# Altium schematic symbol library jlcpcb_2025_04_capacitors_extended_1206.schlib: 2503 symbols (part 9 of 14) (continued)
## EMK316BJ106ML-T
designator C?  Capacitance: 10uF  (hidden comment: *)
Capacitor, Ceramic (MLCC), 10uF, ±20%, 16V, X5R, ±20%, SMD 1206; Manufacturer: Taiyo Yuden; Manufacturer Part Number: EMK316BJ106ML-T; Package Size: 1206; JLCPCB Basic Part: No; JLCPCB Part Number: C412623; Supplier 1: LCSC; Category: Capacitors - MLCC; Supplier Part Number 1: C412623; Tolerance: ±20%; Voltage Rating: 16V; Temperature Coefficient: X5R; RoHS: Yes; ComponentLink1Description: Datasheet; ComponentLink1URL: https://wmsc.lcsc.com/wmsc/upload/file/pdf/v2/lcsc/2211282230_Taiyo-Yuden-EMK316BJ106ML-T_C412623.pdf; ComponentLink2Description: JLCPCB Part URL; ComponentLink2URL: https://jlcpcb.com/partdetail/C412623; ComponentLink3Description: LCSC Part URL; ComponentLink3URL: https://lcsc.com/product-detail/Multilayer-Ceramic-Capacitors-MLCC---SMD-SMT_Taiyo-Yuden-Taiyo-Yuden-EMK316BJ106ML-T_C412623.html
footprint CAP-1206 (1206 (3216M) Capacitor)
pins: 1, 2

## EMK316BJ225KL-T
designator C?  Capacitance: 2.2uF  (hidden comment: *)
Capacitor, Ceramic (MLCC), 2.2uF, ±10%, 16V, X5R, ±10%, SMD 1206; Manufacturer: Taiyo Yuden; Manufacturer Part Number: EMK316BJ225KL-T; Package Size: 1206; JLCPCB Basic Part: No; JLCPCB Part Number: C189991; Supplier 1: LCSC; Category: Capacitors - MLCC; Supplier Part Number 1: C189991; Tolerance: ±10%; Voltage Rating: 16V; Temperature Coefficient: X5R; RoHS: Yes; ComponentLink1Description: Datasheet; ComponentLink1URL: https://wmsc.lcsc.com/wmsc/upload/file/pdf/v2/lcsc/2304140030_Taiyo-Yuden-EMK316BJ225KL-T_C189991.pdf; ComponentLink2Description: JLCPCB Part URL; ComponentLink2URL: https://jlcpcb.com/partdetail/C189991; ComponentLink3Description: LCSC Part URL; ComponentLink3URL: https://lcsc.com/product-detail/Multilayer-Ceramic-Capacitors-MLCC---SMD-SMT_Taiyo-Yuden-Taiyo-Yuden-EMK316BJ225KL-T_C189991.html
footprint CAP-1206 (1206 (3216M) Capacitor)
pins: 1, 2

## EMK316BJ226KL-T
designator C?  Capacitance: 22uF  (hidden comment: *)
Capacitor, Ceramic (MLCC), 22uF, ±10%, 16V, X5R, ±10%, SMD 1206; Manufacturer: Taiyo Yuden; Manufacturer Part Number: EMK316BJ226KL-T; Package Size: 1206; JLCPCB Basic Part: No; JLCPCB Part Number: C268012; Supplier 1: LCSC; Category: Capacitors - MLCC; Supplier Part Number 1: C268012; Tolerance: ±10%; Voltage Rating: 16V; Temperature Coefficient: X5R; RoHS: Yes; ComponentLink1Description: Datasheet; ComponentLink1URL: https://wmsc.lcsc.com/wmsc/upload/file/pdf/v2/lcsc/2211282230_Taiyo-Yuden-EMK316BJ226KL-T_C268012.pdf; ComponentLink2Description: JLCPCB Part URL; ComponentLink2URL: https://jlcpcb.com/partdetail/C268012; ComponentLink3Description: LCSC Part URL; ComponentLink3URL: https://lcsc.com/product-detail/Multilayer-Ceramic-Capacitors-MLCC---SMD-SMT_Taiyo-Yuden-Taiyo-Yuden-EMK316BJ226KL-T_C268012.html
footprint CAP-1206 (1206 (3216M) Capacitor)
pins: 1, 2

## EMK316BJ226ML-T
designator C?  Capacitance: 22uF  (hidden comment: *)
Capacitor, Ceramic (MLCC), 22uF, ±20%, 16V, X5R, ±20%, SMD 1206; Manufacturer: Taiyo Yuden; Manufacturer Part Number: EMK316BJ226ML-T; Package Size: 1206; JLCPCB Basic Part: No; JLCPCB Part Number: C87162; Supplier 1: LCSC; Category: Capacitors - MLCC; Supplier Part Number 1: C87162; Tolerance: ±20%; Voltage Rating: 16V; Temperature Coefficient: X5R; RoHS: Yes; ComponentLink1Description: Datasheet; ComponentLink1URL: https://wmsc.lcsc.com/wmsc/upload/file/pdf/v2/lcsc/2211282300_Taiyo-Yuden-EMK316BJ226ML-T_C87162.pdf; ComponentLink2Description: JLCPCB Part URL; ComponentLink2URL: https://jlcpcb.com/partdetail/C87162; ComponentLink3Description: LCSC Part URL; ComponentLink3URL: https://lcsc.com/product-detail/Multilayer-Ceramic-Capacitors-MLCC---SMD-SMT_Taiyo-Yuden-Taiyo-Yuden-EMK316BJ226ML-T_C87162.html
footprint CAP-1206 (1206 (3216M) Capacitor)
pins: 1, 2

## EMK316BJ475KL-T
designator C?  Capacitance: 4.7uF  (hidden comment: *)
Capacitor, Ceramic (MLCC), 4.7uF, ±10%, 16V, X5R, ±10%, SMD 1206; Manufacturer: Taiyo Yuden; Manufacturer Part Number: EMK316BJ475KL-T; Package Size: 1206; JLCPCB Basic Part: No; JLCPCB Part Number: C92766; Supplier 1: LCSC; Category: Capacitors - MLCC; Supplier Part Number 1: C92766; Tolerance: ±10%; Voltage Rating: 16V; Temperature Coefficient: X5R; RoHS: Yes; ComponentLink1Description: Datasheet; ComponentLink1URL: https://wmsc.lcsc.com/wmsc/upload/file/pdf/v2/lcsc/2211282300_Taiyo-Yuden-EMK316BJ475KL-T_C92766.pdf; ComponentLink2Description: JLCPCB Part URL; ComponentLink2URL: https://jlcpcb.com/partdetail/C92766; ComponentLink3Description: LCSC Part URL; ComponentLink3URL: https://lcsc.com/product-detail/Multilayer-Ceramic-Capacitors-MLCC---SMD-SMT_Taiyo-Yuden-Taiyo-Yuden-EMK316BJ475KL-T_C92766.html
footprint CAP-1206 (1206 (3216M) Capacitor)
pins: 1, 2

## FM31N101J501PXG
designator C?  Capacitance: 100pF  (hidden comment: *)
Capacitor, Ceramic (MLCC), 100pF, ±5%, 500V, C0G, ±5%, SMD 1206; Manufacturer: PSA(Prosperity Dielectrics); Manufacturer Part Number: FM31N101J501PXG; Package Size: 1206; JLCPCB Basic Part: No; JLCPCB Part Number: C525184; Supplier 1: LCSC; Category: Capacitors - MLCC; Supplier Part Number 1: C525184; Tolerance: ±5%; Voltage Rating: 500V; Temperature Coefficient: C0G; RoHS: Yes; ComponentLink1Description: Datasheet; ComponentLink1URL: https://wmsc.lcsc.com/wmsc/upload/file/pdf/v2/lcsc/2304140030_PSA-Prosperity-Dielectrics-FM31N101J501PXG_C525184.pdf; ComponentLink2Description: JLCPCB Part URL; ComponentLink2URL: https://jlcpcb.com/partdetail/C525184; ComponentLink3Description: LCSC Part URL; ComponentLink3URL: https://lcsc.com/product-detail/Multilayer-Ceramic-Capacitors-MLCC---SMD-SMT_PSAProsperity-Dielectrics-PSAProsperity-Dielectrics-FM31N101J501PXG_C525184.html
footprint CAP-1206 (1206 (3216M) Capacitor)
pins: 1, 2

## FM31N102J631EEG
designator C?  Capacitance: 1nF  (hidden comment: *)
Capacitor, Ceramic (MLCC), 1nF, ±5%, 630V, C0G, ±5%, SMD 1206; Manufacturer: PSA(Prosperity Dielectrics); Manufacturer Part Number: FM31N102J631EEG; Package Size: 1206; JLCPCB Basic Part: No; JLCPCB Part Number: C382237; Supplier 1: LCSC; Category: Capacitors - MLCC; Supplier Part Number 1: C382237; Tolerance: ±5%; Voltage Rating: 630V; Temperature Coefficient: C0G; RoHS: Yes; ComponentLink1Description: Datasheet; ComponentLink1URL: https://wmsc.lcsc.com/wmsc/upload/file/pdf/v2/lcsc/2304140030_PSA-Prosperity-Dielectrics-FM31N102J631EEG_C382237.pdf; ComponentLink2Description: JLCPCB Part URL; ComponentLink2URL: https://jlcpcb.com/partdetail/C382237; ComponentLink3Description: LCSC Part URL; ComponentLink3URL: https://lcsc.com/product-detail/Multilayer-Ceramic-Capacitors-MLCC---SMD-SMT_PSAProsperity-Dielectrics-PSAProsperity-Dielectrics-FM31N102J631EEG_C382237.html
footprint CAP-1206 (1206 (3216M) Capacitor)
pins: 1, 2

## FM31N103J101ECG
designator C?  Capacitance: 10nF  (hidden comment: *)
Capacitor, Ceramic (MLCC), 10nF, ±5%, 100V, NP0, ±5%, SMD 1206; Manufacturer: PSA(Prosperity Dielectrics); Manufacturer Part Number: FM31N103J101ECG; Package Size: 1206; JLCPCB Basic Part: No; JLCPCB Part Number: C784087; Supplier 1: LCSC; Category: Capacitors - MLCC; Supplier Part Number 1: C784087; Tolerance: ±5%; Voltage Rating: 100V; Temperature Coefficient: NP0; RoHS: Yes; ComponentLink1Description: Datasheet; ComponentLink1URL: https://wmsc.lcsc.com/wmsc/upload/file/pdf/v2/lcsc/2304140030_PSA-Prosperity-Dielectrics-FM31N103J101ECG_C784087.pdf; ComponentLink2Description: JLCPCB Part URL; ComponentLink2URL: https://jlcpcb.com/partdetail/C784087; ComponentLink3Description: LCSC Part URL; ComponentLink3URL: https://lcsc.com/product-detail/Multilayer-Ceramic-Capacitors-MLCC---SMD-SMT_PSAProsperity-Dielectrics-PSAProsperity-Dielectrics-FM31N103J101ECG_C784087.html
footprint CAP-1206 (1206 (3216M) Capacitor)
pins: 1, 2

## FM31N122J631EEG
designator C?  Capacitance: 1.2nF  (hidden comment: *)
Capacitor, Ceramic (MLCC), 1.2nF, ±5%, 630V, C0G, ±5%, SMD 1206; Manufacturer: PSA(Prosperity Dielectrics); Manufacturer Part Number: FM31N122J631EEG; Package Size: 1206; JLCPCB Basic Part: No; JLCPCB Part Number: C2929774; Supplier 1: LCSC; Category: Capacitors - MLCC; Supplier Part Number 1: C2929774; Tolerance: ±5%; Voltage Rating: 630V; Temperature Coefficient: C0G; RoHS: Yes; ComponentLink1Description: Datasheet; ComponentLink1URL: https://wmsc.lcsc.com/wmsc/upload/file/pdf/v2/lcsc/2209061730_PSA-Prosperity-Dielectrics-FM31N122J631EEG_C2929774.pdf; ComponentLink2Description: JLCPCB Part URL; ComponentLink2URL: https://jlcpcb.com/partdetail/C2929774; ComponentLink3Description: LCSC Part URL; ComponentLink3URL: https://lcsc.com/product-detail/Multilayer-Ceramic-Capacitors-MLCC---SMD-SMT_PSAProsperity-Dielectrics-PSAProsperity-Dielectrics-FM31N122J631EEG_C2929774.html
footprint CAP-1206 (1206 (3216M) Capacitor)
pins: 1, 2

## FM31N152J631EEG
designator C?  Capacitance: 1.5nF  (hidden comment: *)
Capacitor, Ceramic (MLCC), 1.5nF, ±5%, 630V, C0G, ±5%, SMD 1206; Manufacturer: PSA(Prosperity Dielectrics); Manufacturer Part Number: FM31N152J631EEG; Package Size: 1206; JLCPCB Basic Part: No; JLCPCB Part Number: C146175; Supplier 1: LCSC; Category: Capacitors - MLCC; Supplier Part Number 1: C146175; Tolerance: ±5%; Voltage Rating: 630V; Temperature Coefficient: C0G; RoHS: Yes; ComponentLink1Description: Datasheet; ComponentLink1URL: https://wmsc.lcsc.com/wmsc/upload/file/pdf/v2/lcsc/2304140030_PSA-Prosperity-Dielectrics-FM31N152J631EEG_C146175.pdf; ComponentLink2Description: JLCPCB Part URL; ComponentLink2URL: https://jlcpcb.com/partdetail/C146175; ComponentLink3Description: LCSC Part URL; ComponentLink3URL: https://lcsc.com/product-detail/Multilayer-Ceramic-Capacitors-MLCC---SMD-SMT_PSAProsperity-Dielectrics-PSAProsperity-Dielectrics-FM31N152J631EEG_C146175.html
footprint CAP-1206 (1206 (3216M) Capacitor)
pins: 1, 2

## FM31N222J501EEG
designator C?  Capacitance: 2.2nF  (hidden comment: *)
Capacitor, Ceramic (MLCC), 2.2nF, ±5%, 500V, NP0, ±5%, SMD 1206; Manufacturer: PSA(Prosperity Dielectrics); Manufacturer Part Number: FM31N222J501EEG; Package Size: 1206; JLCPCB Basic Part: No; JLCPCB Part Number: C784088; Supplier 1: LCSC; Category: Capacitors - MLCC; Supplier Part Number 1: C784088; Tolerance: ±5%; Voltage Rating: 500V; Temperature Coefficient: NP0; RoHS: Yes; ComponentLink1Description: Datasheet; ComponentLink1URL: https://wmsc.lcsc.com/wmsc/upload/file/pdf/v2/lcsc/2304140030_PSA-Prosperity-Dielectrics-FM31N222J501EEG_C784088.pdf; ComponentLink2Description: JLCPCB Part URL; ComponentLink2URL: https://jlcpcb.com/partdetail/C784088; ComponentLink3Description: LCSC Part URL; ComponentLink3URL: https://lcsc.com/product-detail/Multilayer-Ceramic-Capacitors-MLCC---SMD-SMT_PSAProsperity-Dielectrics-PSAProsperity-Dielectrics-FM31N222J501EEG_C784088.html
footprint CAP-1206 (1206 (3216M) Capacitor)
pins: 1, 2

## FM31N222J631EEG
designator C?  Capacitance: 2.2nF  (hidden comment: *)
Capacitor, Ceramic (MLCC), 2.2nF, ±5%, 630V, NP0, ±5%, SMD 1206; Manufacturer: PSA(Prosperity Dielectrics); Manufacturer Part Number: FM31N222J631EEG; Package Size: 1206; JLCPCB Basic Part: No; JLCPCB Part Number: C784089; Supplier 1: LCSC; Category: Capacitors - MLCC; Supplier Part Number 1: C784089; Tolerance: ±5%; Voltage Rating: 630V; Temperature Coefficient: NP0; RoHS: Yes; ComponentLink1Description: Datasheet; ComponentLink1URL: https://wmsc.lcsc.com/wmsc/upload/file/pdf/v2/lcsc/2304140030_PSA-Prosperity-Dielectrics-FM31N222J631EEG_C784089.pdf; ComponentLink2Description: JLCPCB Part URL; ComponentLink2URL: https://jlcpcb.com/partdetail/C784089; ComponentLink3Description: LCSC Part URL; ComponentLink3URL: https://lcsc.com/product-detail/Multilayer-Ceramic-Capacitors-MLCC---SMD-SMT_PSAProsperity-Dielectrics-PSAProsperity-Dielectrics-FM31N222J631EEG_C784089.html
footprint CAP-1206 (1206 (3216M) Capacitor)
pins: 1, 2

## FM31N270J501PXG
designator C?  Capacitance: 27pF  (hidden comment: *)
Capacitor, Ceramic (MLCC), 27pF, ±5%, 500V, C0G, ±5%, SMD 1206; Manufacturer: PSA(Prosperity Dielectrics); Manufacturer Part Number: FM31N270J501PXG; Package Size: 1206; JLCPCB Basic Part: No; JLCPCB Part Number: C382236; Supplier 1: LCSC; Category: Capacitors - MLCC; Supplier Part Number 1: C382236; Tolerance: ±5%; Voltage Rating: 500V; Temperature Coefficient: C0G; RoHS: Yes; ComponentLink1Description: Datasheet; ComponentLink1URL: https://wmsc.lcsc.com/wmsc/upload/file/pdf/v2/lcsc/2304140030_PSA-Prosperity-Dielectrics-FM31N270J501PXG_C382236.pdf; ComponentLink2Description: JLCPCB Part URL; ComponentLink2URL: https://jlcpcb.com/partdetail/C382236; ComponentLink3Description: LCSC Part URL; ComponentLink3URL: https://lcsc.com/product-detail/Multilayer-Ceramic-Capacitors-MLCC---SMD-SMT_PSAProsperity-Dielectrics-PSAProsperity-Dielectrics-FM31N270J501PXG_C382236.html
footprint CAP-1206 (1206 (3216M) Capacitor)
pins: 1, 2

## FM31N332J101PXG
designator C?  Capacitance: 3.3nF  (hidden comment: *)
Capacitor, Ceramic (MLCC), 3.3nF, ±5%, 100V, C0G, ±5%, SMD 1206; Manufacturer: PSA(Prosperity Dielectrics); Manufacturer Part Number: FM31N332J101PXG; Package Size: 1206; JLCPCB Basic Part: No; JLCPCB Part Number: C2915710; Supplier 1: LCSC; Category: Capacitors - MLCC; Supplier Part Number 1: C2915710; Tolerance: ±5%; Voltage Rating: 100V; Temperature Coefficient: C0G; RoHS: Yes; ComponentLink1Description: Datasheet; ComponentLink1URL: https://wmsc.lcsc.com/wmsc/upload/file/pdf/v2/lcsc/2111161730_PSA-Prosperity-Dielectrics-FM31N332J101PXG_C2915710.pdf; ComponentLink2Description: JLCPCB Part URL; ComponentLink2URL: https://jlcpcb.com/partdetail/C2915710; ComponentLink3Description: LCSC Part URL; ComponentLink3URL: https://lcsc.com/product-detail/Multilayer-Ceramic-Capacitors-MLCC---SMD-SMT_PSAProsperity-Dielectrics-PSAProsperity-Dielectrics-FM31N332J101PXG_C2915710.html
footprint CAP-1206 (1206 (3216M) Capacitor)
pins: 1, 2

## FM31N332J631EEG
designator C?  Capacitance: 3.3nF  (hidden comment: *)
Capacitor, Ceramic (MLCC), 3.3nF, 630V, C0G, SMD 1206; Manufacturer: PSA(Prosperity Dielectrics); Manufacturer Part Number: FM31N332J631EEG; Package Size: 1206; JLCPCB Basic Part: No; JLCPCB Part Number: C2929777; Supplier 1: LCSC; Category: Capacitors - MLCC; Supplier Part Number 1: C2929777; Voltage Rating: 630V; Temperature Coefficient: C0G; RoHS: Yes; ComponentLink1Description: Datasheet; ComponentLink1URL: https://wmsc.lcsc.com/wmsc/upload/file/pdf/v2/lcsc/2209061730_PSA-Prosperity-Dielectrics-FM31N332J631EEG_C2929777.pdf; ComponentLink2Description: JLCPCB Part URL; ComponentLink2URL: https://jlcpcb.com/partdetail/C2929777; ComponentLink3Description: LCSC Part URL; ComponentLink3URL: https://lcsc.com/product-detail/Multilayer-Ceramic-Capacitors-MLCC---SMD-SMT_PSAProsperity-Dielectrics-PSAProsperity-Dielectrics-FM31N332J631EEG_C2929777.html
footprint CAP-1206 (1206 (3216M) Capacitor)
pins: 1, 2

## FM31N472J101PXG
designator C?  Capacitance: 4.7nF  (hidden comment: *)
Capacitor, Ceramic (MLCC), 4.7nF, ±5%, 100V, C0G, ±5%, SMD 1206; Manufacturer: PSA(Prosperity Dielectrics); Manufacturer Part Number: FM31N472J101PXG; Package Size: 1206; JLCPCB Basic Part: No; JLCPCB Part Number: C2915711; Supplier 1: LCSC; Category: Capacitors - MLCC; Supplier Part Number 1: C2915711; Tolerance: ±5%; Voltage Rating: 100V; Temperature Coefficient: C0G; RoHS: Yes; ComponentLink1Description: Datasheet; ComponentLink1URL: https://wmsc.lcsc.com/wmsc/upload/file/pdf/v2/lcsc/2111161730_PSA-Prosperity-Dielectrics-FM31N472J101PXG_C2915711.pdf; ComponentLink2Description: JLCPCB Part URL; ComponentLink2URL: https://jlcpcb.com/partdetail/C2915711; ComponentLink3Description: LCSC Part URL; ComponentLink3URL: https://lcsc.com/product-detail/Multilayer-Ceramic-Capacitors-MLCC---SMD-SMT_PSAProsperity-Dielectrics-PSAProsperity-Dielectrics-FM31N472J101PXG_C2915711.html
footprint CAP-1206 (1206 (3216M) Capacitor)
pins: 1, 2

## FM31N472J251EEG
designator C?  Capacitance: 4.7nF  (hidden comment: *)
Capacitor, Ceramic (MLCC), 4.7nF, ±5%, 250V, NP0, ±5%, SMD 1206; Manufacturer: PSA(Prosperity Dielectrics); Manufacturer Part Number: FM31N472J251EEG; Package Size: 1206; JLCPCB Basic Part: No; JLCPCB Part Number: C784090; Supplier 1: LCSC; Category: Capacitors - MLCC; Supplier Part Number 1: C784090; Tolerance: ±5%; Voltage Rating: 250V; Temperature Coefficient: NP0; RoHS: Yes; ComponentLink1Description: Datasheet; ComponentLink1URL: https://wmsc.lcsc.com/wmsc/upload/file/pdf/v2/lcsc/2304140030_PSA-Prosperity-Dielectrics-FM31N472J251EEG_C784090.pdf; ComponentLink2Description: JLCPCB Part URL; ComponentLink2URL: https://jlcpcb.com/partdetail/C784090; ComponentLink3Description: LCSC Part URL; ComponentLink3URL: https://lcsc.com/product-detail/Multilayer-Ceramic-Capacitors-MLCC---SMD-SMT_PSAProsperity-Dielectrics-PSAProsperity-Dielectrics-FM31N472J251EEG_C784090.html
footprint CAP-1206 (1206 (3216M) Capacitor)
pins: 1, 2

## FM31N472J631EEG
designator C?  Capacitance: 4.7nF  (hidden comment: *)
Capacitor, Ceramic (MLCC), 4.7nF, ±5%, 630V, ±5%, SMD 1206; Manufacturer: PSA(Prosperity Dielectrics); Manufacturer Part Number: FM31N472J631EEG; Package Size: 1206; JLCPCB Basic Part: No; JLCPCB Part Number: C1021627; Supplier 1: LCSC; Category: Capacitors - MLCC; Supplier Part Number 1: C1021627; Tolerance: ±5%; Voltage Rating: 630V; RoHS: Yes; ComponentLink1Description: Datasheet; ComponentLink1URL: https://wmsc.lcsc.com/wmsc/upload/file/pdf/v2/lcsc/2304140030_PSA-Prosperity-Dielectrics-FM31N472J631EEG_C1021627.pdf; ComponentLink2Description: JLCPCB Part URL; ComponentLink2URL: https://jlcpcb.com/partdetail/C1021627; ComponentLink3Description: LCSC Part URL; ComponentLink3URL: https://lcsc.com/product-detail/Multilayer-Ceramic-Capacitors-MLCC---SMD-SMT_PSAProsperity-Dielectrics-PSAProsperity-Dielectrics-FM31N472J631EEG_C1021627.html
footprint CAP-1206 (1206 (3216M) Capacitor)
pins: 1, 2

## FM31N562J251EEG
designator C?  Capacitance: 5.6nF  (hidden comment: *)
Capacitor, Ceramic (MLCC), 5.6nF, ±5%, 250V, C0G, ±5%, SMD 1206; Manufacturer: PSA(Prosperity Dielectrics); Manufacturer Part Number: FM31N562J251EEG; Package Size: 1206; JLCPCB Basic Part: No; JLCPCB Part Number: C2929112; Supplier 1: LCSC; Category: Capacitors - MLCC; Supplier Part Number 1: C2929112; Tolerance: ±5%; Voltage Rating: 250V; Temperature Coefficient: C0G; RoHS: Yes; ComponentLink1Description: Datasheet; ComponentLink1URL: https://wmsc.lcsc.com/wmsc/upload/file/pdf/v2/lcsc/2201121400_PSA-Prosperity-Dielectrics-FM31N562J251EEG_C2929112.pdf; ComponentLink2Description: JLCPCB Part URL; ComponentLink2URL: https://jlcpcb.com/partdetail/C2929112; ComponentLink3Description: LCSC Part URL; ComponentLink3URL: https://lcsc.com/product-detail/Multilayer-Ceramic-Capacitors-MLCC---SMD-SMT_PSAProsperity-Dielectrics-PSAProsperity-Dielectrics-FM31N562J251EEG_C2929112.html
footprint CAP-1206 (1206 (3216M) Capacitor)
pins: 1, 2

## FM31N681J631ECG
designator C?  Capacitance: 680pF  (hidden comment: *)
Capacitor, Ceramic (MLCC), 680pF, ±5%, 630V, C0G, ±5%, SMD 1206; Manufacturer: PSA(Prosperity Dielectrics); Manufacturer Part Number: FM31N681J631ECG; Package Size: 1206; JLCPCB Basic Part: No; JLCPCB Part Number: C2929698; Supplier 1: LCSC; Category: Capacitors - MLCC; Supplier Part Number 1: C2929698; Tolerance: ±5%; Voltage Rating: 630V; Temperature Coefficient: C0G; RoHS: Yes; ComponentLink1Description: Datasheet; ComponentLink1URL: https://wmsc.lcsc.com/wmsc/upload/file/pdf/v2/lcsc/2201121430_PSA-Prosperity-Dielectrics-FM31N681J631ECG_C2929698.pdf; ComponentLink2Description: JLCPCB Part URL; ComponentLink2URL: https://jlcpcb.com/partdetail/C2929698; ComponentLink3Description: LCSC Part URL; ComponentLink3URL: https://lcsc.com/product-detail/Multilayer-Ceramic-Capacitors-MLCC---SMD-SMT_PSAProsperity-Dielectrics-PSAProsperity-Dielectrics-FM31N681J631ECG_C2929698.html
footprint CAP-1206 (1206 (3216M) Capacitor)
pins: 1, 2

## FM31X102K201ECG
designator C?  Capacitance: 1nF  (hidden comment: *)
Capacitor, Ceramic (MLCC), 1nF, ±10%, 200V, X7R, ±10%, SMD 1206; Manufacturer: PSA(Prosperity Dielectrics); Manufacturer Part Number: FM31X102K201ECG; Package Size: 1206; JLCPCB Basic Part: No; JLCPCB Part Number: C525185; Supplier 1: LCSC; Category: Capacitors - MLCC; Supplier Part Number 1: C525185; Tolerance: ±10%; Voltage Rating: 200V; Temperature Coefficient: X7R; RoHS: Yes; ComponentLink1Description: Datasheet; ComponentLink1URL: https://wmsc.lcsc.com/wmsc/upload/file/pdf/v2/lcsc/2304140030_PSA-Prosperity-Dielectrics-FM31X102K201ECG_C525185.pdf; ComponentLink2Description: JLCPCB Part URL; ComponentLink2URL: https://jlcpcb.com/partdetail/C525185; ComponentLink3Description: LCSC Part URL; ComponentLink3URL: https://lcsc.com/product-detail/Multilayer-Ceramic-Capacitors-MLCC---SMD-SMT_PSAProsperity-Dielectrics-PSAProsperity-Dielectrics-FM31X102K201ECG_C525185.html
footprint CAP-1206 (1206 (3216M) Capacitor)
pins: 1, 2

## FM31X102K501ECG
designator C?  Capacitance: 1nF  (hidden comment: *)
Capacitor, Ceramic (MLCC), 1nF, ±10%, 500V, X7R, ±10%, SMD 1206; Manufacturer: PSA(Prosperity Dielectrics); Manufacturer Part Number: FM31X102K501ECG; Package Size: 1206; JLCPCB Basic Part: No; JLCPCB Part Number: C525186; Supplier 1: LCSC; Category: Capacitors - MLCC; Supplier Part Number 1: C525186; Tolerance: ±10%; Voltage Rating: 500V; Temperature Coefficient: X7R; RoHS: Yes; ComponentLink1Description: Datasheet; ComponentLink1URL: https://wmsc.lcsc.com/wmsc/upload/file/pdf/v2/lcsc/2304140030_PSA-Prosperity-Dielectrics-FM31X102K501ECG_C525186.pdf; ComponentLink2Description: JLCPCB Part URL; ComponentLink2URL: https://jlcpcb.com/partdetail/C525186; ComponentLink3Description: LCSC Part URL; ComponentLink3URL: https://lcsc.com/product-detail/Multilayer-Ceramic-Capacitors-MLCC---SMD-SMT_PSAProsperity-Dielectrics-PSAProsperity-Dielectrics-FM31X102K501ECG_C525186.html
footprint CAP-1206 (1206 (3216M) Capacitor)
pins: 1, 2

## FM31X103K101PXG
designator C?  Capacitance: 10nF  (hidden comment: *)
Capacitor, Ceramic (MLCC), 10nF, ±10%, 100V, X7R, ±10%, SMD 1206; Manufacturer: PSA(Prosperity Dielectrics); Manufacturer Part Number: FM31X103K101PXG; Package Size: 1206; JLCPCB Basic Part: No; JLCPCB Part Number: C2915712; Supplier 1: LCSC; Category: Capacitors - MLCC; Supplier Part Number 1: C2915712; Tolerance: ±10%; Voltage Rating: 100V; Temperature Coefficient: X7R; RoHS: Yes; ComponentLink1Description: Datasheet; ComponentLink1URL: https://wmsc.lcsc.com/wmsc/upload/file/pdf/v2/lcsc/2111161730_PSA-Prosperity-Dielectrics-FM31X103K101PXG_C2915712.pdf; ComponentLink2Description: JLCPCB Part URL; ComponentLink2URL: https://jlcpcb.com/partdetail/C2915712; ComponentLink3Description: LCSC Part URL; ComponentLink3URL: https://lcsc.com/product-detail/Multilayer-Ceramic-Capacitors-MLCC---SMD-SMT_PSAProsperity-Dielectrics-PSAProsperity-Dielectrics-FM31X103K101PXG_C2915712.html
footprint CAP-1206 (1206 (3216M) Capacitor)
pins: 1, 2

## FM31X103K251PXG
designator C?  Capacitance: 10nF  (hidden comment: *)
Capacitor, Ceramic (MLCC), 10nF, ±10%, 250V, X7R, ±10%, SMD 1206; Manufacturer: PSA(Prosperity Dielectrics); Manufacturer Part Number: FM31X103K251PXG; Package Size: 1206; JLCPCB Basic Part: No; JLCPCB Part Number: C382233; Supplier 1: LCSC; Category: Capacitors - MLCC; Supplier Part Number 1: C382233; Tolerance: ±10%; Voltage Rating: 250V; Temperature Coefficient: X7R; RoHS: Yes; ComponentLink1Description: Datasheet; ComponentLink1URL: https://wmsc.lcsc.com/wmsc/upload/file/pdf/v2/lcsc/2304140030_PSA-Prosperity-Dielectrics-FM31X103K251PXG_C382233.pdf; ComponentLink2Description: JLCPCB Part URL; ComponentLink2URL: https://jlcpcb.com/partdetail/C382233; ComponentLink3Description: LCSC Part URL; ComponentLink3URL: https://lcsc.com/product-detail/Multilayer-Ceramic-Capacitors-MLCC---SMD-SMT_PSAProsperity-Dielectrics-PSAProsperity-Dielectrics-FM31X103K251PXG_C382233.html
footprint CAP-1206 (1206 (3216M) Capacitor)
pins: 1, 2

## FM31X103K631ECG
designator C?  Capacitance: 10nF  (hidden comment: *)
Capacitor, Ceramic (MLCC), 10nF, ±10%, 630V, X7R, ±10%, SMD 1206; Manufacturer: PSA(Prosperity Dielectrics); Manufacturer Part Number: FM31X103K631ECG; Package Size: 1206; JLCPCB Basic Part: No; JLCPCB Part Number: C382232; Supplier 1: LCSC; Category: Capacitors - MLCC; Supplier Part Number 1: C382232; Tolerance: ±10%; Voltage Rating: 630V; Temperature Coefficient: X7R; RoHS: Yes; ComponentLink1Description: Datasheet; ComponentLink1URL: https://wmsc.lcsc.com/wmsc/upload/file/pdf/v2/lcsc/2304140030_PSA-Prosperity-Dielectrics-FM31X103K631ECG_C382232.pdf; ComponentLink2Description: JLCPCB Part URL; ComponentLink2URL: https://jlcpcb.com/partdetail/C382232; ComponentLink3Description: LCSC Part URL; ComponentLink3URL: https://lcsc.com/product-detail/Multilayer-Ceramic-Capacitors-MLCC---SMD-SMT_PSAProsperity-Dielectrics-PSAProsperity-Dielectrics-FM31X103K631ECG_C382232.html
footprint CAP-1206 (1206 (3216M) Capacitor)
pins: 1, 2

## FM31X104K101ECG
designator C?  Capacitance: 100nF  (hidden comment: *)
Capacitor, Ceramic (MLCC), 100nF, ±10%, 100V, X7R, ±10%, SMD 1206; Manufacturer: PSA(Prosperity Dielectrics); Manufacturer Part Number: FM31X104K101ECG; Package Size: 1206; JLCPCB Basic Part: No; JLCPCB Part Number: C525187; Supplier 1: LCSC; Category: Capacitors - MLCC; Supplier Part Number 1: C525187; Tolerance: ±10%; Voltage Rating: 100V; Temperature Coefficient: X7R; RoHS: Yes; ComponentLink1Description: Datasheet; ComponentLink1URL: https://wmsc.lcsc.com/wmsc/upload/file/pdf/v2/lcsc/2304140030_PSA-Prosperity-Dielectrics-FM31X104K101ECG_C525187.pdf; ComponentLink2Description: JLCPCB Part URL; ComponentLink2URL: https://jlcpcb.com/partdetail/C525187; ComponentLink3Description: LCSC Part URL; ComponentLink3URL: https://lcsc.com/product-detail/Multilayer-Ceramic-Capacitors-MLCC---SMD-SMT_PSAProsperity-Dielectrics-PSAProsperity-Dielectrics-FM31X104K101ECG_C525187.html
footprint CAP-1206 (1206 (3216M) Capacitor)
pins: 1, 2

## FM31X104K251EEG
designator C?  Capacitance: 100nF  (hidden comment: *)
Capacitor, Ceramic (MLCC), 100nF, ±10%, 250V, X7R, ±10%, SMD 1206; Manufacturer: PSA(Prosperity Dielectrics); Manufacturer Part Number: FM31X104K251EEG; Package Size: 1206; JLCPCB Basic Part: No; JLCPCB Part Number: C365814; Supplier 1: LCSC; Category: Capacitors - MLCC; Supplier Part Number 1: C365814; Tolerance: ±10%; Voltage Rating: 250V; Temperature Coefficient: X7R; RoHS: Yes; ComponentLink1Description: Datasheet; ComponentLink1URL: https://wmsc.lcsc.com/wmsc/upload/file/pdf/v2/lcsc/2304140030_PSA-Prosperity-Dielectrics-FM31X104K251EEG_C365814.pdf; ComponentLink2Description: JLCPCB Part URL; ComponentLink2URL: https://jlcpcb.com/partdetail/C365814; ComponentLink3Description: LCSC Part URL; ComponentLink3URL: https://lcsc.com/product-detail/Multilayer-Ceramic-Capacitors-MLCC---SMD-SMT_PSAProsperity-Dielectrics-PSAProsperity-Dielectrics-FM31X104K251EEG_C365814.html
footprint CAP-1206 (1206 (3216M) Capacitor)
pins: 1, 2

## FM31X104K451EEG
designator C?  Capacitance: 100nF  (hidden comment: *)
Capacitor, Ceramic (MLCC), 100nF, ±10%, 450V, X7R, ±10%, SMD 1206; Manufacturer: PSA(Prosperity Dielectrics); Manufacturer Part Number: FM31X104K451EEG; Package Size: 1206; JLCPCB Basic Part: No; JLCPCB Part Number: C784091; Supplier 1: LCSC; Category: Capacitors - MLCC; Supplier Part Number 1: C784091; Tolerance: ±10%; Voltage Rating: 450V; Temperature Coefficient: X7R; RoHS: Yes; ComponentLink1Description: Datasheet; ComponentLink1URL: https://wmsc.lcsc.com/wmsc/upload/file/pdf/v2/lcsc/2304140030_PSA-Prosperity-Dielectrics-FM31X104K451EEG_C784091.pdf; ComponentLink2Description: JLCPCB Part URL; ComponentLink2URL: https://jlcpcb.com/partdetail/C784091; ComponentLink3Description: LCSC Part URL; ComponentLink3URL: https://lcsc.com/product-detail/Multilayer-Ceramic-Capacitors-MLCC---SMD-SMT_PSAProsperity-Dielectrics-PSAProsperity-Dielectrics-FM31X104K451EEG_C784091.html
footprint CAP-1206 (1206 (3216M) Capacitor)
pins: 1, 2

## FM31X153K251ECG
designator C?  Capacitance: 15nF  (hidden comment: *)
Capacitor, Ceramic (MLCC), 15nF, ±10%, 250V, ±10%, SMD 1206; Manufacturer: PSA(Prosperity Dielectrics); Manufacturer Part Number: FM31X153K251ECG; Package Size: 1206; JLCPCB Basic Part: No; JLCPCB Part Number: C784092; Supplier 1: LCSC; Category: Capacitors - MLCC; Supplier Part Number 1: C784092; Tolerance: ±10%; Voltage Rating: 250V; RoHS: Yes; ComponentLink1Description: Datasheet; ComponentLink1URL: https://wmsc.lcsc.com/wmsc/upload/file/pdf/v2/lcsc/2304140030_PSA-Prosperity-Dielectrics-FM31X153K251ECG_C784092.pdf; ComponentLink2Description: JLCPCB Part URL; ComponentLink2URL: https://jlcpcb.com/partdetail/C784092; ComponentLink3Description: LCSC Part URL; ComponentLink3URL: https://lcsc.com/product-detail/Multilayer-Ceramic-Capacitors-MLCC---SMD-SMT_PSAProsperity-Dielectrics-PSAProsperity-Dielectrics-FM31X153K251ECG_C784092.html
footprint CAP-1206 (1206 (3216M) Capacitor)
pins: 1, 2

## FM31X221K501ECG
designator C?  Capacitance: 220pF  (hidden comment: *)
Capacitor, Ceramic (MLCC), 220pF, ±10%, 500V, X7R, ±10%, SMD 1206; Manufacturer: PSA(Prosperity Dielectrics); Manufacturer Part Number: FM31X221K501ECG; Package Size: 1206; JLCPCB Basic Part: No; JLCPCB Part Number: C382231; Supplier 1: LCSC; Category: Capacitors - MLCC; Supplier Part Number 1: C382231; Tolerance: ±10%; Voltage Rating: 500V; Temperature Coefficient: X7R; RoHS: Yes; ComponentLink1Description: Datasheet; ComponentLink1URL: https://wmsc.lcsc.com/wmsc/upload/file/pdf/v2/lcsc/2304140030_PSA-Prosperity-Dielectrics-FM31X221K501ECG_C382231.pdf; ComponentLink2Description: JLCPCB Part URL; ComponentLink2URL: https://jlcpcb.com/partdetail/C382231; ComponentLink3Description: LCSC Part URL; ComponentLink3URL: https://lcsc.com/product-detail/Multilayer-Ceramic-Capacitors-MLCC---SMD-SMT_PSAProsperity-Dielectrics-PSAProsperity-Dielectrics-FM31X221K501ECG_C382231.html
footprint CAP-1206 (1206 (3216M) Capacitor)
pins: 1, 2

## FM31X222K631ECG
designator C?  Capacitance: 2.2nF  (hidden comment: *)
Capacitor, Ceramic (MLCC), 2.2nF, ±10%, 630V, X7R, ±10%, SMD 1206; Manufacturer: PSA(Prosperity Dielectrics); Manufacturer Part Number: FM31X222K631ECG; Package Size: 1206; JLCPCB Basic Part: No; JLCPCB Part Number: C2929114; Supplier 1: LCSC; Category: Capacitors - MLCC; Supplier Part Number 1: C2929114; Tolerance: ±10%; Voltage Rating: 630V; Temperature Coefficient: X7R; RoHS: Yes; ComponentLink1Description: Datasheet; ComponentLink1URL: https://wmsc.lcsc.com/wmsc/upload/file/pdf/v2/lcsc/2201121400_PSA-Prosperity-Dielectrics-FM31X222K631ECG_C2929114.pdf; ComponentLink2Description: JLCPCB Part URL; ComponentLink2URL: https://jlcpcb.com/partdetail/C2929114; ComponentLink3Description: LCSC Part URL; ComponentLink3URL: https://lcsc.com/product-detail/Multilayer-Ceramic-Capacitors-MLCC---SMD-SMT_PSAProsperity-Dielectrics-PSAProsperity-Dielectrics-FM31X222K631ECG_C2929114.html
footprint CAP-1206 (1206 (3216M) Capacitor)
pins: 1, 2

## FM31X223K201ECG
designator C?  Capacitance: 22nF  (hidden comment: *)
Capacitor, Ceramic (MLCC), 22nF, ±10%, 200V, X7R, ±10%, SMD 1206; Manufacturer: PSA(Prosperity Dielectrics); Manufacturer Part Number: FM31X223K201ECG; Package Size: 1206; JLCPCB Basic Part: No; JLCPCB Part Number: C382230; Supplier 1: LCSC; Category: Capacitors - MLCC; Supplier Part Number 1: C382230; Tolerance: ±10%; Voltage Rating: 200V; Temperature Coefficient: X7R; RoHS: Yes; ComponentLink1Description: Datasheet; ComponentLink1URL: https://wmsc.lcsc.com/wmsc/upload/file/pdf/v2/lcsc/2304140030_PSA-Prosperity-Dielectrics-FM31X223K201ECG_C382230.pdf; ComponentLink2Description: JLCPCB Part URL; ComponentLink2URL: https://jlcpcb.com/partdetail/C382230; ComponentLink3Description: LCSC Part URL; ComponentLink3URL: https://lcsc.com/product-detail/Multilayer-Ceramic-Capacitors-MLCC---SMD-SMT_PSAProsperity-Dielectrics-PSAProsperity-Dielectrics-FM31X223K201ECG_C382230.html
footprint CAP-1206 (1206 (3216M) Capacitor)
pins: 1, 2

## FM31X223K251ECG
designator C?  Capacitance: 22nF  (hidden comment: *)
Capacitor, Ceramic (MLCC), 22nF, 250V, X7R, SMD 1206; Manufacturer: PSA(Prosperity Dielectrics); Manufacturer Part Number: FM31X223K251ECG; Package Size: 1206; JLCPCB Basic Part: No; JLCPCB Part Number: C2915716; Supplier 1: LCSC; Category: Capacitors - MLCC; Supplier Part Number 1: C2915716; Voltage Rating: 250V; Temperature Coefficient: X7R; RoHS: Yes; ComponentLink1Description: Datasheet; ComponentLink1URL: https://wmsc.lcsc.com/wmsc/upload/file/pdf/v2/lcsc/2111161730_PSA-Prosperity-Dielectrics-FM31X223K251ECG_C2915716.pdf; ComponentLink2Description: JLCPCB Part URL; ComponentLink2URL: https://jlcpcb.com/partdetail/C2915716; ComponentLink3Description: LCSC Part URL; ComponentLink3URL: https://lcsc.com/product-detail/Multilayer-Ceramic-Capacitors-MLCC---SMD-SMT_PSAProsperity-Dielectrics-PSAProsperity-Dielectrics-FM31X223K251ECG_C2915716.html
footprint CAP-1206 (1206 (3216M) Capacitor)
pins: 1, 2

## FM31X223K501EEG
designator C?  Capacitance: 22nF  (hidden comment: *)
Capacitor, Ceramic (MLCC), 22nF, ±10%, 500V, X7R, ±10%, SMD 1206; Manufacturer: PSA(Prosperity Dielectrics); Manufacturer Part Number: FM31X223K501EEG; Package Size: 1206; JLCPCB Basic Part: No; JLCPCB Part Number: C382229; Supplier 1: LCSC; Category: Capacitors - MLCC; Supplier Part Number 1: C382229; Tolerance: ±10%; Voltage Rating: 500V; Temperature Coefficient: X7R; RoHS: Yes; ComponentLink1Description: Datasheet; ComponentLink1URL: https://wmsc.lcsc.com/wmsc/upload/file/pdf/v2/lcsc/2304140030_PSA-Prosperity-Dielectrics-FM31X223K501EEG_C382229.pdf; ComponentLink2Description: JLCPCB Part URL; ComponentLink2URL: https://jlcpcb.com/partdetail/C382229; ComponentLink3Description: LCSC Part URL; ComponentLink3URL: https://lcsc.com/product-detail/Multilayer-Ceramic-Capacitors-MLCC---SMD-SMT_PSAProsperity-Dielectrics-PSAProsperity-Dielectrics-FM31X223K501EEG_C382229.html
footprint CAP-1206 (1206 (3216M) Capacitor)
pins: 1, 2

## FM31X223K631EEG
designator C?  Capacitance: 22nF  (hidden comment: *)
Capacitor, Ceramic (MLCC), 22nF, ±10%, 630V, X7R, ±10%, SMD 1206; Manufacturer: PSA(Prosperity Dielectrics); Manufacturer Part Number: FM31X223K631EEG; Package Size: 1206; JLCPCB Basic Part: No; JLCPCB Part Number: C382228; Supplier 1: LCSC; Category: Capacitors - MLCC; Supplier Part Number 1: C382228; Tolerance: ±10%; Voltage Rating: 630V; Temperature Coefficient: X7R; RoHS: Yes; ComponentLink1Description: Datasheet; ComponentLink1URL: https://wmsc.lcsc.com/wmsc/upload/file/pdf/v2/lcsc/2304140030_PSA-Prosperity-Dielectrics-FM31X223K631EEG_C382228.pdf; ComponentLink2Description: JLCPCB Part URL; ComponentLink2URL: https://jlcpcb.com/partdetail/C382228; ComponentLink3Description: LCSC Part URL; ComponentLink3URL: https://lcsc.com/product-detail/Multilayer-Ceramic-Capacitors-MLCC---SMD-SMT_PSAProsperity-Dielectrics-PSAProsperity-Dielectrics-FM31X223K631EEG_C382228.html
footprint CAP-1206 (1206 (3216M) Capacitor)
pins: 1, 2

## FM31X224K101ECG
designator C?  Capacitance: 220nF  (hidden comment: *)
Capacitor, Ceramic (MLCC), 220nF, ±10%, 100V, X7R, ±10%, SMD 1206; Manufacturer: Walsin Tech Corp; Manufacturer Part Number: FM31X224K101ECG; Package Size: 1206; JLCPCB Basic Part: No; JLCPCB Part Number: C2909489; Supplier 1: LCSC; Category: Capacitors - MLCC; Supplier Part Number 1: C2909489; Tolerance: ±10%; Voltage Rating: 100V; Temperature Coefficient: X7R; RoHS: Yes; ComponentLink1Description: Datasheet; ComponentLink2Description: JLCPCB Part URL; ComponentLink2URL: https://jlcpcb.com/partdetail/C2909489; ComponentLink3Description: LCSC Part URL; ComponentLink3URL: https://lcsc.com/product-detail/Multilayer-Ceramic-Capacitors-MLCC---SMD-SMT_Walsin-Tech-Corp-Walsin-Tech-Corp-FM31X224K101ECG_C2909489.html
footprint CAP-1206 (1206 (3216M) Capacitor)
pins: 1, 2

## FM31X224K101EEG
designator C?  Capacitance: 220nF  (hidden comment: *)
Capacitor, Ceramic (MLCC), 220nF, 100V, X7R, SMD 1206; Manufacturer: PSA(Prosperity Dielectrics); Manufacturer Part Number: FM31X224K101EEG; Package Size: 1206; JLCPCB Basic Part: No; JLCPCB Part Number: C2847455; Supplier 1: LCSC; Category: Capacitors - MLCC; Supplier Part Number 1: C2847455; Voltage Rating: 100V; Temperature Coefficient: X7R; RoHS: Yes; ComponentLink1Description: Datasheet; ComponentLink1URL: https://wmsc.lcsc.com/wmsc/upload/file/pdf/v2/lcsc/2108142230_PSA-Prosperity-Dielectrics-FM31X224K101EEG_C2847455.pdf; ComponentLink2Description: JLCPCB Part URL; ComponentLink2URL: https://jlcpcb.com/partdetail/C2847455; ComponentLink3Description: LCSC Part URL; ComponentLink3URL: https://lcsc.com/product-detail/Multilayer-Ceramic-Capacitors-MLCC---SMD-SMT_PSAProsperity-Dielectrics-PSAProsperity-Dielectrics-FM31X224K101EEG_C2847455.html
footprint CAP-1206 (1206 (3216M) Capacitor)
pins: 1, 2

## FM31X224K201EEG
designator C?  Capacitance: 220nF  (hidden comment: *)
Capacitor, Ceramic (MLCC), 220nF, 200V, X7R, SMD 1206; Manufacturer: PSA(Prosperity Dielectrics); Manufacturer Part Number: FM31X224K201EEG; Package Size: 1206; JLCPCB Basic Part: No; JLCPCB Part Number: C2847454; Supplier 1: LCSC; Category: Capacitors - MLCC; Supplier Part Number 1: C2847454; Voltage Rating: 200V; Temperature Coefficient: X7R; RoHS: Yes; ComponentLink1Description: Datasheet; ComponentLink1URL: https://wmsc.lcsc.com/wmsc/upload/file/pdf/v2/lcsc/2108142230_PSA-Prosperity-Dielectrics-FM31X224K201EEG_C2847454.pdf; ComponentLink2Description: JLCPCB Part URL; ComponentLink2URL: https://jlcpcb.com/partdetail/C2847454; ComponentLink3Description: LCSC Part URL; ComponentLink3URL: https://lcsc.com/product-detail/Multilayer-Ceramic-Capacitors-MLCC---SMD-SMT_PSAProsperity-Dielectrics-PSAProsperity-Dielectrics-FM31X224K201EEG_C2847454.html
footprint CAP-1206 (1206 (3216M) Capacitor)
pins: 1, 2

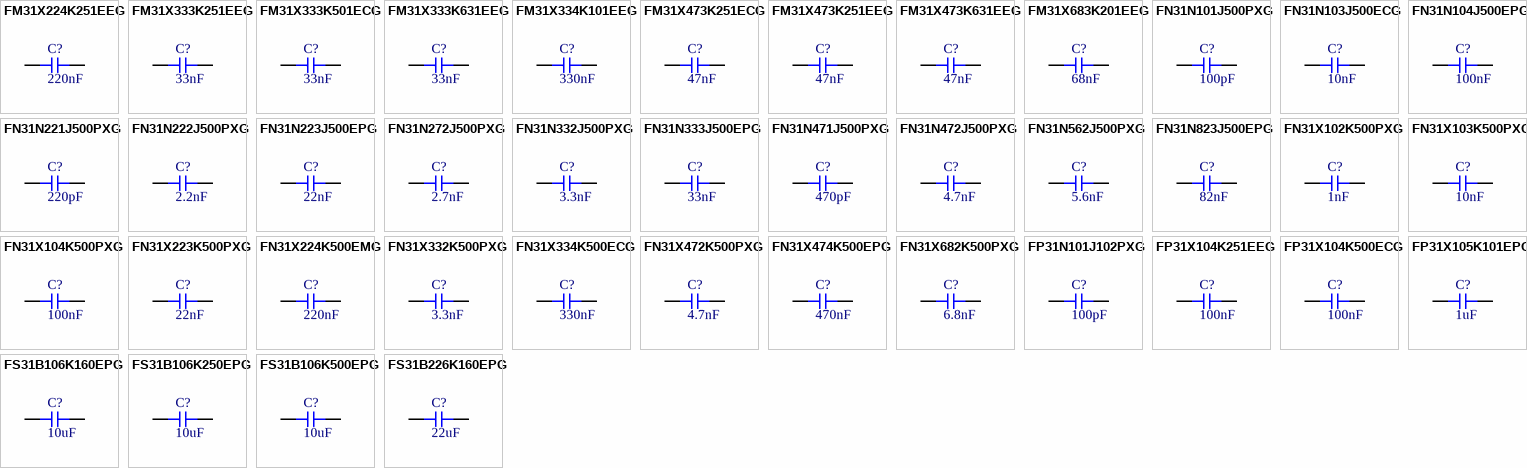
[diagram p41: symbols FM31X224K251EEG to FS31B226K160EPG]

## FM31X224K251EEG
designator C?  Capacitance: 220nF  (hidden comment: *)
Capacitor, Ceramic (MLCC), 220nF, ±10%, 250V, ±10%, SMD 1206; Manufacturer: PSA(Prosperity Dielectrics); Manufacturer Part Number: FM31X224K251EEG; Package Size: 1206; JLCPCB Basic Part: No; JLCPCB Part Number: C976240; Supplier 1: LCSC; Category: Capacitors - MLCC; Supplier Part Number 1: C976240; Tolerance: ±10%; Voltage Rating: 250V; RoHS: Yes; ComponentLink1Description: Datasheet; ComponentLink1URL: https://wmsc.lcsc.com/wmsc/upload/file/pdf/v2/lcsc/2012171207_PSA-Prosperity-Dielectrics-FM31X224K251EEG_C976240.pdf; ComponentLink2Description: JLCPCB Part URL; ComponentLink2URL: https://jlcpcb.com/partdetail/C976240; ComponentLink3Description: LCSC Part URL; ComponentLink3URL: https://lcsc.com/product-detail/Multilayer-Ceramic-Capacitors-MLCC---SMD-SMT_PSAProsperity-Dielectrics-PSAProsperity-Dielectrics-FM31X224K251EEG_C976240.html
footprint CAP-1206 (1206 (3216M) Capacitor)
pins: 1, 2

## FM31X333K251EEG
designator C?  Capacitance: 33nF  (hidden comment: *)
Capacitor, Ceramic (MLCC), 33nF, ±10%, 250V, X7R, ±10%, SMD 1206; Manufacturer: PSA(Prosperity Dielectrics); Manufacturer Part Number: FM31X333K251EEG; Package Size: 1206; JLCPCB Basic Part: No; JLCPCB Part Number: C2847435; Supplier 1: LCSC; Category: Capacitors - MLCC; Supplier Part Number 1: C2847435; Tolerance: ±10%; Voltage Rating: 250V; Temperature Coefficient: X7R; RoHS: Yes; ComponentLink1Description: Datasheet; ComponentLink1URL: https://wmsc.lcsc.com/wmsc/upload/file/pdf/v2/lcsc/2108142230_PSA-Prosperity-Dielectrics-FM31X333K251EEG_C2847435.pdf; ComponentLink2Description: JLCPCB Part URL; ComponentLink2URL: https://jlcpcb.com/partdetail/C2847435; ComponentLink3Description: LCSC Part URL; ComponentLink3URL: https://lcsc.com/product-detail/Multilayer-Ceramic-Capacitors-MLCC---SMD-SMT_PSAProsperity-Dielectrics-PSAProsperity-Dielectrics-FM31X333K251EEG_C2847435.html
footprint CAP-1206 (1206 (3216M) Capacitor)
pins: 1, 2

## FM31X333K501ECG
designator C?  Capacitance: 33nF  (hidden comment: *)
Capacitor, Ceramic (MLCC), 33nF, ±10%, 500V, X7R, ±10%, SMD 1206; Manufacturer: PSA(Prosperity Dielectrics); Manufacturer Part Number: FM31X333K501ECG; Package Size: 1206; JLCPCB Basic Part: No; JLCPCB Part Number: C2915718; Supplier 1: LCSC; Category: Capacitors - MLCC; Supplier Part Number 1: C2915718; Tolerance: ±10%; Voltage Rating: 500V; Temperature Coefficient: X7R; RoHS: Yes; ComponentLink1Description: Datasheet; ComponentLink1URL: https://wmsc.lcsc.com/wmsc/upload/file/pdf/v2/lcsc/2111161730_PSA-Prosperity-Dielectrics-FM31X333K501ECG_C2915718.pdf; ComponentLink2Description: JLCPCB Part URL; ComponentLink2URL: https://jlcpcb.com/partdetail/C2915718; ComponentLink3Description: LCSC Part URL; ComponentLink3URL: https://lcsc.com/product-detail/Multilayer-Ceramic-Capacitors-MLCC---SMD-SMT_PSAProsperity-Dielectrics-PSAProsperity-Dielectrics-FM31X333K501ECG_C2915718.html
footprint CAP-1206 (1206 (3216M) Capacitor)
pins: 1, 2

## FM31X333K631EEG
designator C?  Capacitance: 33nF  (hidden comment: *)
Capacitor, Ceramic (MLCC), 33nF, ±10%, 630V, X7R, ±10%, SMD 1206; Manufacturer: PSA(Prosperity Dielectrics); Manufacturer Part Number: FM31X333K631EEG; Package Size: 1206; JLCPCB Basic Part: No; JLCPCB Part Number: C464971; Supplier 1: LCSC; Category: Capacitors - MLCC; Supplier Part Number 1: C464971; Tolerance: ±10%; Voltage Rating: 630V; Temperature Coefficient: X7R; RoHS: Yes; ComponentLink1Description: Datasheet; ComponentLink1URL: https://wmsc.lcsc.com/wmsc/upload/file/pdf/v2/lcsc/2304140030_PSA-Prosperity-Dielectrics-FM31X333K631EEG_C464971.pdf; ComponentLink2Description: JLCPCB Part URL; ComponentLink2URL: https://jlcpcb.com/partdetail/C464971; ComponentLink3Description: LCSC Part URL; ComponentLink3URL: https://lcsc.com/product-detail/Multilayer-Ceramic-Capacitors-MLCC---SMD-SMT_PSAProsperity-Dielectrics-PSAProsperity-Dielectrics-FM31X333K631EEG_C464971.html
footprint CAP-1206 (1206 (3216M) Capacitor)
pins: 1, 2

## FM31X334K101EEG
designator C?  Capacitance: 330nF  (hidden comment: *)
Capacitor, Ceramic (MLCC), 330nF, ±10%, 100V, X7R, ±10%, SMD 1206; Manufacturer: PSA(Prosperity Dielectrics); Manufacturer Part Number: FM31X334K101EEG; Package Size: 1206; JLCPCB Basic Part: No; JLCPCB Part Number: C571510; Supplier 1: LCSC; Category: Capacitors - MLCC; Supplier Part Number 1: C571510; Tolerance: ±10%; Voltage Rating: 100V; Temperature Coefficient: X7R; RoHS: Yes; ComponentLink1Description: Datasheet; ComponentLink1URL: https://wmsc.lcsc.com/wmsc/upload/file/pdf/v2/lcsc/2204291416_PSA-Prosperity-Dielectrics-FM31X334K101EEG_C571510.pdf; ComponentLink2Description: JLCPCB Part URL; ComponentLink2URL: https://jlcpcb.com/partdetail/C571510; ComponentLink3Description: LCSC Part URL; ComponentLink3URL: https://lcsc.com/product-detail/Multilayer-Ceramic-Capacitors-MLCC---SMD-SMT_PSAProsperity-Dielectrics-PSAProsperity-Dielectrics-FM31X334K101EEG_C571510.html
footprint CAP-1206 (1206 (3216M) Capacitor)
pins: 1, 2

## FM31X473K251ECG
designator C?  Capacitance: 47nF  (hidden comment: *)
Capacitor, Ceramic (MLCC), 47nF, ±10%, 250V, X7R, ±10%, SMD 1206; Manufacturer: PSA(Prosperity Dielectrics); Manufacturer Part Number: FM31X473K251ECG; Package Size: 1206; JLCPCB Basic Part: No; JLCPCB Part Number: C2915719; Supplier 1: LCSC; Category: Capacitors - MLCC; Supplier Part Number 1: C2915719; Tolerance: ±10%; Voltage Rating: 250V; Temperature Coefficient: X7R; RoHS: Yes; ComponentLink1Description: Datasheet; ComponentLink1URL: https://wmsc.lcsc.com/wmsc/upload/file/pdf/v2/lcsc/2111161730_PSA-Prosperity-Dielectrics-FM31X473K251ECG_C2915719.pdf; ComponentLink2Description: JLCPCB Part URL; ComponentLink2URL: https://jlcpcb.com/partdetail/C2915719; ComponentLink3Description: LCSC Part URL; ComponentLink3URL: https://lcsc.com/product-detail/Multilayer-Ceramic-Capacitors-MLCC---SMD-SMT_PSAProsperity-Dielectrics-PSAProsperity-Dielectrics-FM31X473K251ECG_C2915719.html
footprint CAP-1206 (1206 (3216M) Capacitor)
pins: 1, 2

## FM31X473K251EEG
designator C?  Capacitance: 47nF  (hidden comment: *)
Capacitor, Ceramic (MLCC), 47nF, ±10%, 250V, X7R, ±10%, SMD 1206; Manufacturer: PSA(Prosperity Dielectrics); Manufacturer Part Number: FM31X473K251EEG; Package Size: 1206; JLCPCB Basic Part: No; JLCPCB Part Number: C692283; Supplier 1: LCSC; Category: Capacitors - MLCC; Supplier Part Number 1: C692283; Tolerance: ±10%; Voltage Rating: 250V; Temperature Coefficient: X7R; RoHS: Yes; ComponentLink1Description: Datasheet; ComponentLink1URL: https://wmsc.lcsc.com/wmsc/upload/file/pdf/v2/lcsc/2304140030_PSA-Prosperity-Dielectrics-FM31X473K251EEG_C692283.pdf; ComponentLink2Description: JLCPCB Part URL; ComponentLink2URL: https://jlcpcb.com/partdetail/C692283; ComponentLink3Description: LCSC Part URL; ComponentLink3URL: https://lcsc.com/product-detail/Multilayer-Ceramic-Capacitors-MLCC---SMD-SMT_PSAProsperity-Dielectrics-PSAProsperity-Dielectrics-FM31X473K251EEG_C692283.html
footprint CAP-1206 (1206 (3216M) Capacitor)
pins: 1, 2

## FM31X473K631EEG
designator C?  Capacitance: 47nF  (hidden comment: *)
Capacitor, Ceramic (MLCC), 47nF, ±10%, 630V, X7R, ±10%, SMD 1206; Manufacturer: PSA(Prosperity Dielectrics); Manufacturer Part Number: FM31X473K631EEG; Package Size: 1206; JLCPCB Basic Part: No; JLCPCB Part Number: C382225; Supplier 1: LCSC; Category: Capacitors - MLCC; Supplier Part Number 1: C382225; Tolerance: ±10%; Voltage Rating: 630V; Temperature Coefficient: X7R; RoHS: Yes; ComponentLink1Description: Datasheet; ComponentLink1URL: https://wmsc.lcsc.com/wmsc/upload/file/pdf/v2/lcsc/2304140030_PSA-Prosperity-Dielectrics-FM31X473K631EEG_C382225.pdf; ComponentLink2Description: JLCPCB Part URL; ComponentLink2URL: https://jlcpcb.com/partdetail/C382225; ComponentLink3Description: LCSC Part URL; ComponentLink3URL: https://lcsc.com/product-detail/Multilayer-Ceramic-Capacitors-MLCC---SMD-SMT_PSAProsperity-Dielectrics-PSAProsperity-Dielectrics-FM31X473K631EEG_C382225.html
footprint CAP-1206 (1206 (3216M) Capacitor)
pins: 1, 2

## FM31X683K201EEG
designator C?  Capacitance: 68nF  (hidden comment: *)
Capacitor, Ceramic (MLCC), 68nF, ±10%, 200V, X7R, ±10%, SMD 1206; Manufacturer: PSA(Prosperity Dielectrics); Manufacturer Part Number: FM31X683K201EEG; Package Size: 1206; JLCPCB Basic Part: No; JLCPCB Part Number: C382223; Supplier 1: LCSC; Category: Capacitors - MLCC; Supplier Part Number 1: C382223; Tolerance: ±10%; Voltage Rating: 200V; Temperature Coefficient: X7R; RoHS: Yes; ComponentLink1Description: Datasheet; ComponentLink1URL: https://wmsc.lcsc.com/wmsc/upload/file/pdf/v2/lcsc/2304140030_PSA-Prosperity-Dielectrics-FM31X683K201EEG_C382223.pdf; ComponentLink2Description: JLCPCB Part URL; ComponentLink2URL: https://jlcpcb.com/partdetail/C382223; ComponentLink3Description: LCSC Part URL; ComponentLink3URL: https://lcsc.com/product-detail/Multilayer-Ceramic-Capacitors-MLCC---SMD-SMT_PSAProsperity-Dielectrics-PSAProsperity-Dielectrics-FM31X683K201EEG_C382223.html
footprint CAP-1206 (1206 (3216M) Capacitor)
pins: 1, 2